# Altium footprint library 1MaxPcb.PcbLib: 187 footprints (part 8 of 12)
Each footprint in its own frame and in the unit in brackets; x right, y up, seen from the top. Pads: shape width x height; smd on the part's side, far side on the other; paste and mask are expansions set on the pad; w line width, h text height; cw(c..) or ccw(c..) is an arc to the next point about the centre after c.
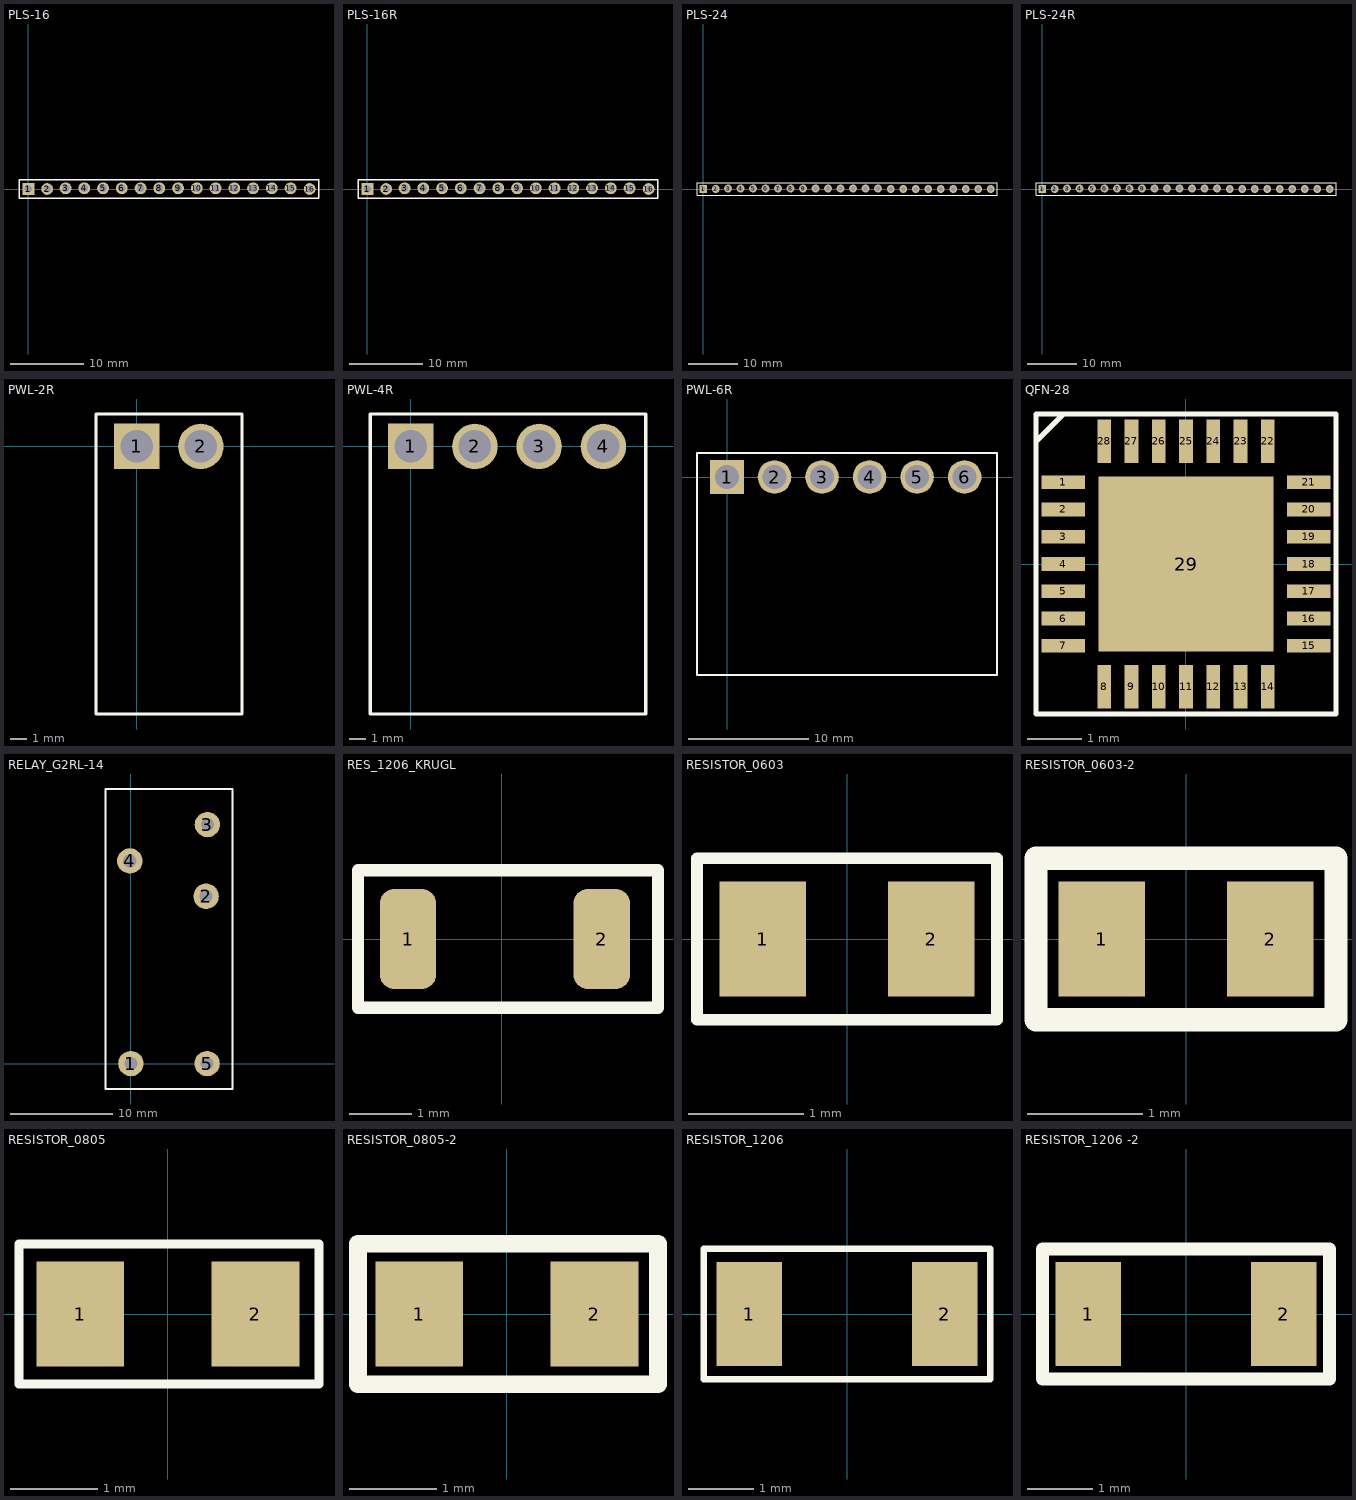
[diagram p7: the footprints below, top view; thin cyan lines are the x and y axes]

## PLS-16 [mm]
height 9
pads (16):
  rect 1.6x1.6 hole 1: 1(0,0)
  round 1.6 hole 1: 2(2.54,0) 3(5.04,0.093) 4(7.58,0.093) 5(10.12,0.093) 6(12.66,0.093) 7(15.2,0.093) 8(17.74,0.093) 9(20.28,0.093) 10(22.82,0.093) 11(25.36,0.093) 12(27.9,0.093) 13(30.44,0.093) 14(32.98,0.093) 15(35.52,0.093) 16(38.1,0)
Top Overlay:
  lines w0.2: -1.27,-1.27 39.37,-1.27 39.37,1.27 -1.27,1.27 -1.27,-1.27
3D body "PLS-8.STEP": height 8.8, standoff -3, extent 19.05,-1.27 39.37,1.27
3D body "PLS-8.STEP": height 8.8, standoff -3, extent -1.27,-1.27 19.05,1.27

## PLS-16R [mm] "PLS-16R"
height 9
pads (16):
  rect 1.6x1.6 hole 1: 1(0,0)
  round 1.6 hole 1: 2(2.54,0) 3(5.04,0.093) 4(7.58,0.093) 5(10.12,0.093) 6(12.66,0.093) 7(15.2,0.093) 8(17.74,0.093) 9(20.28,0.093) 10(22.82,0.093) 11(25.36,0.093) 12(27.9,0.093) 13(30.44,0.093) 14(32.98,0.093) 15(35.52,0.093) 16(38.1,0)
Top Overlay:
  lines w0.2: -1.27,-1.27 -1.27,1.27 39.37,1.27 39.37,-1.27 -1.27,-1.27
3D body "PLS-8R gold.step": height 5.45, standoff -3, extent -1.27,-1.27 19.05,7.35
3D body "PLS-8R gold.step": height 5.45, standoff -3, extent 19.05,-1.27 39.37,7.35

## PLS-24 [mm]
height 9
pads (24):
  rect 1.6x1.6 hole 1: 1(0,0)
  round 1.6 hole 1: 2(2.54,0) 3(5.04,0.093) 4(7.58,0.093) 5(10.12,0.093) 6(12.66,0.093) 7(15.2,0.093) 8(17.74,0.093) 9(20.28,0.093) 10(22.82,0.093) 11(25.36,0.093) 12(27.9,0.093) 13(30.44,0.093) 14(32.98,0.093) 15(35.52,0.093) 16(38.1,0) 17(40.635,0) 18(43.175,0) 19(45.715,0) 20(48.255,0) 21(50.795,0) 22(53.335,0) 23(55.875,0) 24(58.415,0)
Top Overlay:
  lines w0.2: -1.27,-1.27 59.69,-1.27 59.69,1.27 -1.27,1.27 -1.27,-1.27
3D body "PLS-10.STEP": height 8.8, standoff -3, extent -1.27,-1.27 24.13,1.27
3D body "PLS-10.STEP": height 8.8, standoff -3, extent 24.13,-1.27 49.53,1.27
3D body "PLS-4.STEP": height 8.8, standoff -3, extent 49.53,-1.27 59.69,1.27

## PLS-24R [mm] "PLS-24R"
height 9
pads (24):
  rect 1.6x1.6 hole 1: 1(0,0)
  round 1.6 hole 1: 2(2.54,0) 3(5.04,0.093) 4(7.58,0.093) 5(10.12,0.093) 6(12.66,0.093) 7(15.2,0.093) 8(17.74,0.093) 9(20.28,0.093) 10(22.82,0.093) 11(25.36,0.093) 12(27.9,0.093) 13(30.44,0.093) 14(32.98,0.093) 15(35.52,0.093) 16(38.1,0) 17(40.635,0) 18(43.175,0) 19(45.715,0) 20(48.255,0) 21(50.795,0) 22(53.335,0) 23(55.875,0) 24(58.415,0)
Top Overlay:
  lines w0.2: -1.27,-1.27 -1.27,1.27 59.69,1.27 59.69,-1.27 -1.27,-1.27
3D body "PLS-4R gold.step": height 5.45, standoff -3, extent 49.53,-1 59.69,7.62
3D body "PLS-10R gold.step": height 5.45, standoff -3, extent -1.27,-1 24.13,7.62
3D body "PLS-10R gold.step": height 5.45, standoff -3, extent 24.13,-1 49.53,7.62

## PWL-2R [mm] "P.C.B CONNCETOR PITCH 3.96mm"
pads (2):
  rect 2.8x2.8 hole 2: 1(0,0)
  round 2.8 hole 2: 2(3.96,0)
Top Overlay:
  lines w0.2: -2.5,-16.5 6.5,-16.5 6.5,2 -2.5,2 -2.5,-16.5
3D body "User Library-PWL-2R.STEP": height 10.4, standoff -3.7, extent -1.96,-16.768 5.96,0.5

## PWL-4R [mm] "P.C.B CONNCETOR PITCH 3.96mm"
pads (4):
  rect 2.8x2.8 hole 2: 1(0,0)
  round 2.8 hole 2: 2(3.96,0) 3(7.92,0) 4(11.88,0)
Top Overlay:
  lines w0.2: -2.5,-16.5 -2.5,2 14.5,2 14.5,-16.5 -2.5,-16.5
3D body "User Library-PWL-4R.STEP": height 10.4, standoff -3.7, extent -1.92,-16.8 13.92,0.468

## PWL-6R [mm] "P.C.B CONNCETOR PITCH 3.96mm"
pads (6):
  rect 2.8x2.8 hole 2: 1(0,0)
  round 2.8 hole 2: 2(3.96,0) 3(7.92,0) 4(11.88,0) 5(15.84,0) 6(19.8,0)
Top Overlay:
  lines w0.2: -2.5,-16.5 -2.5,2 22.5,2 22.5,-16.5 -2.5,-16.5
3D body "User Library-PWL-6R.STEP": height 10.4, standoff -3.7, extent -2,-16.634 21.76,0.634

## QFN-28 [mm]
pads (29):
  rect 0.8x0.25 smd: 1(-2.25,1.5) 2(-2.25,1) 3(-2.25,0.5) 4(-2.25,0) 5(-2.25,-0.5) 6(-2.25,-1) 7(-2.25,-1.5) 15(2.25,-1.5) 16(2.25,-1) 17(2.25,-0.5) 18(2.25,0) 19(2.25,0.5) 20(2.25,1) 21(2.25,1.5)
  rect 0.25x0.8 smd: 8(-1.5,-2.25) 9(-1,-2.25) 10(-0.5,-2.25) 11(0,-2.25) 12(0.5,-2.25) 13(1,-2.25) 14(1.5,-2.25) 22(1.5,2.25) 23(1,2.25) 24(0.5,2.25) 25(0,2.25) 26(-0.5,2.25) 27(-1,2.25) 28(-1.5,2.25)
  rect 3.2x3.2 smd: 29(0,0)
Top Overlay:
  lines w0.1: -2.75,2.25 -2.25,2.75 ; -2.75,-2.75 2.75,-2.75 2.75,2.75 -2.75,2.75 -2.75,-2.75
3D body "QFN-28 5x5mm.stp": height 1.05, standoff 0, extent -2.5,-2.5 2.5,2.5

## RELAY_G2RL-14 [mm]
pads (5):
  round 2.5 hole 1.3: 1(0,0) 2(7.4,16.45) 3(7.525,23.5) 4(-0.1,19.925) 5(7.5,0)
Top Overlay:
  lines w0.2: -2.5,-2.5 -2.5,27 10,27 10,-2.5 -2.5,-2.5
3D body "33620.stp": height 15.7, standoff -3.5, extent -2.65,-2.3 10.05,26.7

## RES_1206_KRUGL [mm]
pads (2):
  rrect50% 0.9x1.6 smd: 1(-1.5,0) 2(1.6,0)
Top Overlay:
  lines w0.2: -2.3,-1.1 -2.3,1.1 -1.5,1.1 2.5,1.1 2.5,-1.1 -2.3,-1.1
3D body "R1206.STEP": height 0.53, standoff -0.01, extent -1.607,-0.855 1.607,0.875

## RESISTOR_0603 [mm]
height 0.45
pads (2):
  rect 0.75x1 smd mask+0.03: 1(-0.73,0) 2(0.73,0)
Top Overlay:
  lines w0.1: -1.3,-0.7 1.3,-0.7 1.3,0.7 -1.3,0.7 -1.3,-0.7
3D body "res0603.STEP": height 0.47, standoff 0, extent -0.805,-0.4 0.795,0.402

## RESISTOR_0603-2 [mm]
height 0.45
pads (2):
  rect 0.75x1 smd mask+0.03: 1(-0.73,0) 2(0.73,0)
Top Overlay:
  lines w0.2: -1.3,-0.7 1.3,-0.7 1.3,0.7 -1.3,0.7 -1.3,-0.7
3D body "res0603.STEP": height 0.47, standoff 0, extent -0.805,-0.4 0.795,0.402

## RESISTOR_0805 [mm]
height 0.5
pads (2):
  rect 1x1.2 smd mask+0.03: 1(-1,0) 2(1,0)
Top Overlay:
  lines w0.1: -1.7,-0.8 -1.7,0.8 1.725,0.8 1.725,-0.8 -1.7,-0.8
3D body "res0805.STEP": height 0.57, standoff 0, extent -1,-0.626 1,0.626

## RESISTOR_0805-2 [mm]
height 0.5
pads (2):
  rect 1x1.2 smd mask+0.03: 1(-1,0) 2(1,0)
Top Overlay:
  lines w0.2: -1.7,-0.8 1.725,-0.8 1.725,0.8 -1.7,0.8 -1.7,-0.8
3D body "res0805.STEP": height 0.57, standoff 0, extent -1,-0.626 1,0.626

## RESISTOR_1206 [mm]
height 0.55
pads (2):
  rect 1x1.6 smd mask+0.03: 1(-1.5,0) 2(1.5,0)
Top Overlay:
  lines w0.1: -2.2,-1 2.2,-1 2.2,1 -2.2,1 -2.2,-1
3D body "res1206.STEP": height 0.57, standoff 0, extent -1.525,-0.75 1.575,0.802

## RESISTOR_1206 -2 [mm]
height 0.55
pads (2):
  rect 1x1.6 smd mask+0.03: 1(-1.5,0) 2(1.5,0)
Top Overlay:
  lines w0.2: -2.2,-1 -2.2,1 2.2,1 2.2,-1 -2.2,-1
3D body "res1206.STEP": height 0.57, standoff 0, extent -1.525,-0.75 1.575,0.802